# Altium footprint library PART.PcbLib: 407 footprints (part 1 of 26)
Each footprint in its own frame and in the unit in brackets; x right, y up, seen from the top. Pads: shape width x height; smd on the part's side, far side on the other; paste and mask are expansions set on the pad; w line width, h text height; cw(c..) or ccw(c..) is an arc to the next point about the centre after c.
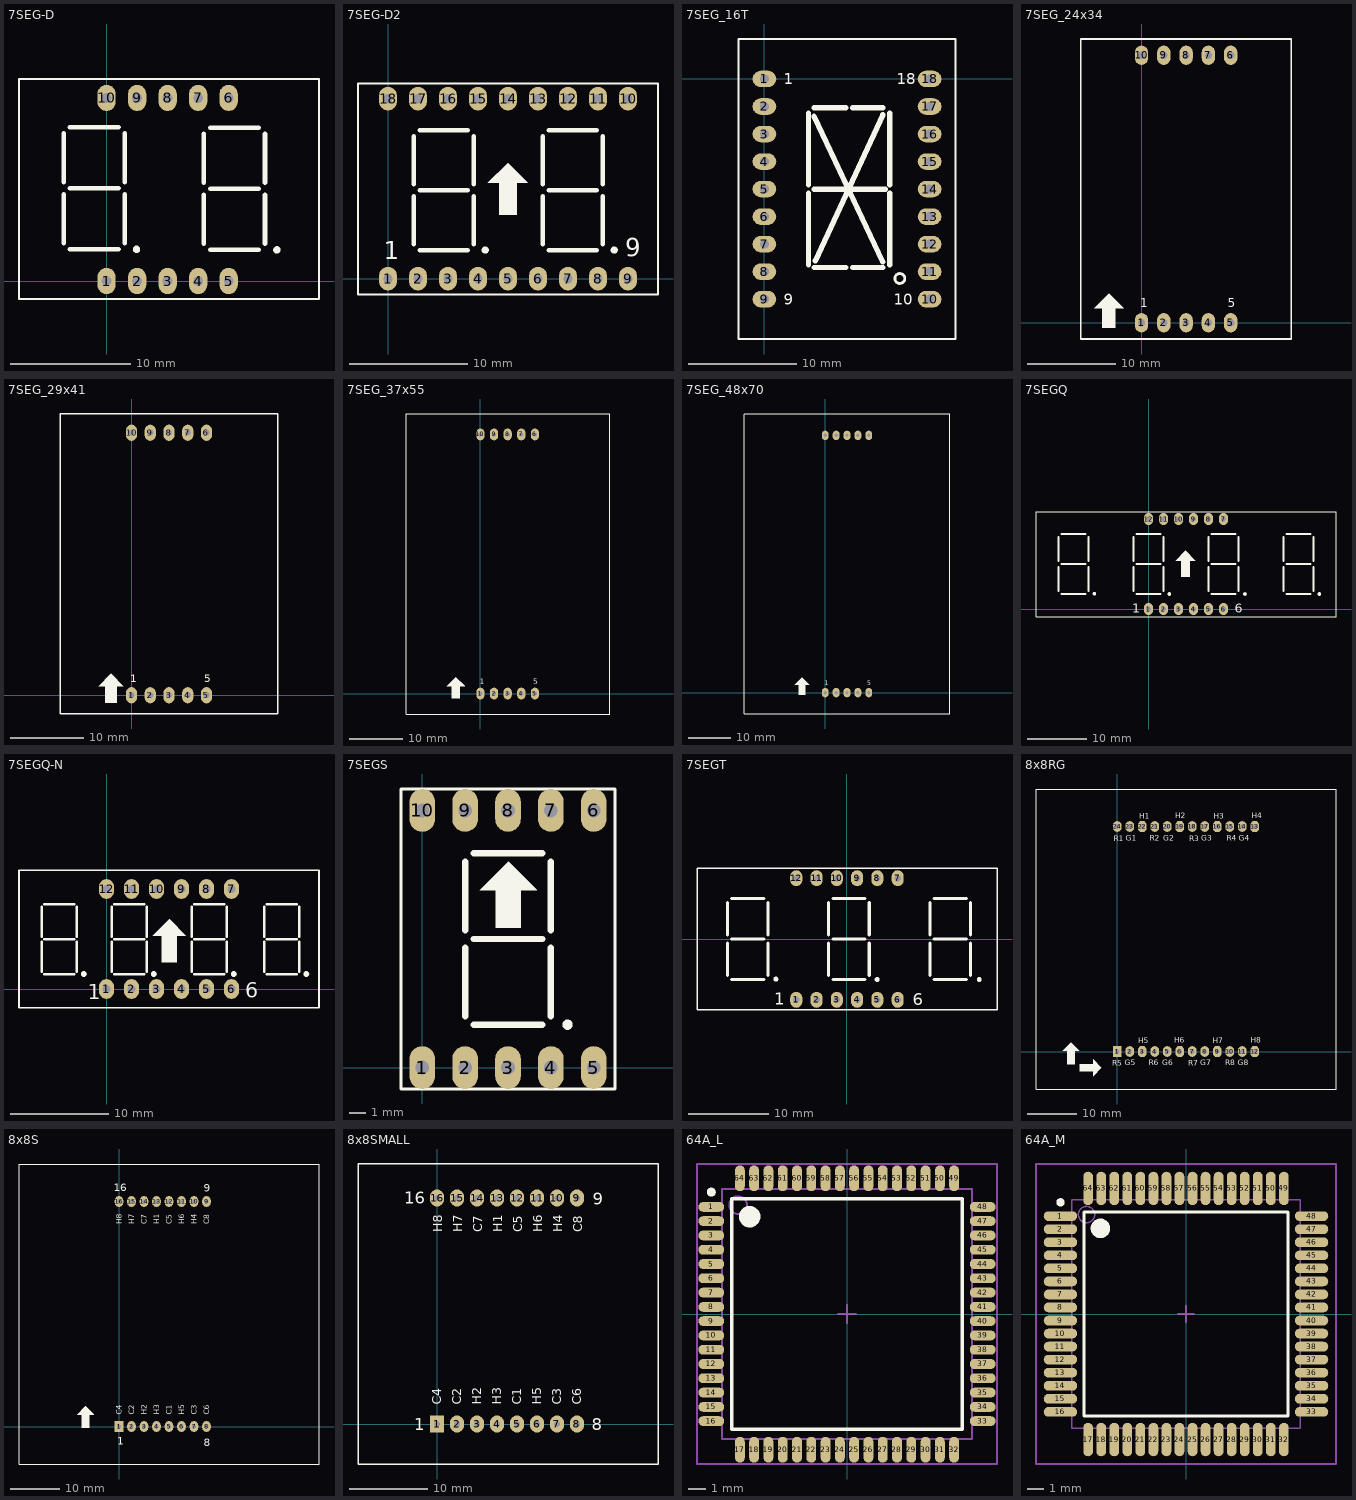
[diagram p0: the footprints below, top view; thin cyan lines are the x and y axes]

## 7SEG-D [mil] "DIP 10 Leads; Body 25 x 19 mm; Pitch 0.5 mm"
height 300
pads (10):
  oval 60x86 hole 32: 1(0,0) 2(100,0) 3(200,0) 4(300,0) 5(400,0) 6(400,600) 7(300,600) 8(200,600) 9(100,600) 10(0,600)
Top Overlay:
  circle w12: c558,102 r6
  circle w12: c98,104 r6
  lines w7: -287,-59 696,-59 696,662 -287,662 -287,-59
  lines w15: -141,124 -141,284 ; -141,124 -141,284 ; -141,124 -141,284 ; -141,124 -141,284 ; -141,124 -141,284 ; -141,124 -141,284 ; -141,124 -141,284 ; -141,124 -141,284 ; -141,324 -141,484 ; -141,324 -141,484 ; -141,324 -141,484 ; -141,324 -141,484 ; -141,324 -141,484 ; -141,324 -141,484 ; -141,324 -141,484 ; -141,324 -141,484 ; -121,104 39,104 ; -121,104 39,104 ; -121,104 39,104 ; -121,104 39,104 ; -121,304 39,304 ; -121,304 39,304 ; -121,304 39,304 ; -121,304 39,304 ; -121,304 39,304 ; -121,304 39,304 ; -121,304 39,304 ; -121,304 39,304 ; -121,504 39,504 ; -121,504 39,504 ; -121,504 39,504 ; -121,504 39,504 ; 59,124 59,284 ; 59,124 59,284 ; 59,124 59,284 ; 59,124 59,284 ; 59,124 59,284 ; 59,124 59,284 ; 59,124 59,284 ; 59,124 59,284 ; 59,324 59,484 ; 59,324 59,484 ; 59,324 59,484 ; 59,324 59,484 ; 59,324 59,484 ; 59,324 59,484 ; 59,324 59,484 ; 59,324 59,484 ; 319,122 319,282 ; 319,122 319,282 ; 319,122 319,282 ; 319,122 319,282 ; 319,122 319,282 ; 319,122 319,282 ; 319,122 319,282 ; 319,122 319,282 ; 319,322 319,482 ; 319,322 319,482 ; 319,322 319,482 ; 319,322 319,482 ; 319,322 319,482 ; 319,322 319,482 ; 319,322 319,482 ; 319,322 319,482 ; 339,102 499,102 ; 339,102 499,102 ; 339,102 499,102 ; 339,102 499,102 ; 339,302 499,302 ; 339,302 499,302 ; 339,302 499,302 ; 339,302 499,302 ; 339,302 499,302 ; 339,302 499,302 ; 339,302 499,302 ; 339,302 499,302 ; 339,502 499,502 ; 339,502 499,502 ; 339,502 499,502 ; 339,502 499,502 ; 519,122 519,282 ; 519,122 519,282 ; 519,122 519,282 ; 519,122 519,282 ; 519,122 519,282 ; 519,122 519,282 ; 519,122 519,282 ; 519,122 519,282 ; 519,322 519,482 ; 519,322 519,482 ; 519,322 519,482 ; 519,322 519,482 ; 519,322 519,482 ; 519,322 519,482 ; 519,322 519,482 ; 519,322 519,482

## 7SEG-D2 [mm] "DIP 18Leads; Body 24 x 15 mm; Pitch 0.5 mm"
height 7.62
pads (18):
  oval 1.524x2 hole 0.8 paste+0: 1(0,0) 2(2.54,0) 3(5.08,0) 5(10.16,0) 6(12.7,0) 7(15.24,0) 8(17.78,0) 9(20.32,0) 10(20.32,15.24) 11(17.78,15.24) 12(15.24,15.24) 13(12.7,15.24) 14(10.16,15.24) 15(7.62,15.24) 16(5.08,15.24) 17(2.54,15.24) 18(0,15.24)
  oval 1.524x2 hole 0.8: 4(7.62,0)
Top Overlay:
  circle w0.305: c8.23,2.413 r0.152
  circle w0.305: c19.152,2.413 r0.152
  region: 8.458,8.103 10.135,9.779 10.185,9.779 11.836,8.128 11.836,8.103 10.897,8.103 10.897,5.41 9.398,5.41 9.398,8.103
  lines w0.178: -2.54,-1.333 -2.54,16.51 ; -2.54,-1.333 -2.54,16.51 ; -2.54,-1.333 -2.54,16.51 ; -2.54,-1.333 -2.54,16.51 ; -2.54,16.51 22.86,16.51 ; -2.54,16.51 22.86,16.51 ; -2.54,16.51 22.86,16.51 ; -2.54,16.51 22.86,16.51 ; 22.86,-1.333 22.86,16.51 ; 22.86,-1.333 22.86,16.51 ; 22.86,-1.333 -2.54,-1.321 22.86,-1.333 ; 22.86,-1.333 22.86,16.51 ; 22.86,-1.333 22.86,16.51
  lines w0.381: 2.159,2.921 2.159,6.985 ; 2.159,2.921 2.159,6.985 ; 2.159,2.921 2.159,6.985 ; 2.159,2.921 2.159,6.985 ; 2.159,2.921 2.159,6.985 ; 2.159,2.921 2.159,6.985 ; 2.159,2.921 2.159,6.985 ; 2.159,2.921 2.159,6.985 ; 2.159,8.001 2.159,12.065 ; 2.159,8.001 2.159,12.065 ; 2.159,8.001 2.159,12.065 ; 2.159,8.001 2.159,12.065 ; 2.159,8.001 2.159,12.065 ; 2.159,8.001 2.159,12.065 ; 2.159,8.001 2.159,12.065 ; 2.159,8.001 2.159,12.065 ; 2.667,2.413 6.731,2.413 ; 2.667,2.413 6.731,2.413 ; 2.667,2.413 6.731,2.413 ; 2.667,2.413 6.731,2.413 ; 2.667,7.493 6.731,7.493 ; 2.667,7.493 6.731,7.493 ; 2.667,7.493 6.731,7.493 ; 2.667,7.493 6.731,7.493 ; 2.667,7.493 6.731,7.493 ; 2.667,7.493 6.731,7.493 ; 2.667,7.493 6.731,7.493 ; 2.667,7.493 6.731,7.493 ; 2.667,12.573 6.731,12.573 ; 2.667,12.573 6.731,12.573 ; 2.667,12.573 6.731,12.573 ; 2.667,12.573 6.731,12.573 ; 7.239,2.921 7.239,6.985 ; 7.239,2.921 7.239,6.985 ; 7.239,2.921 7.239,6.985 ; 7.239,2.921 7.239,6.985 ; 7.239,2.921 7.239,6.985 ; 7.239,2.921 7.239,6.985 ; 7.239,2.921 7.239,6.985 ; 7.239,2.921 7.239,6.985 ; 7.239,8.001 7.239,12.065 ; 7.239,8.001 7.239,12.065 ; 7.239,8.001 7.239,12.065 ; 7.239,8.001 7.239,12.065 ; 7.239,8.001 7.239,12.065 ; 7.239,8.001 7.239,12.065 ; 7.239,8.001 7.239,12.065 ; 7.239,8.001 7.239,12.065 ; 13.081,2.921 13.081,6.985 ; 13.081,2.921 13.081,6.985 ; 13.081,2.921 13.081,6.985 ; 13.081,2.921 13.081,6.985 ; 13.081,2.921 13.081,6.985 ; 13.081,2.921 13.081,6.985 ; 13.081,2.921 13.081,6.985 ; 13.081,2.921 13.081,6.985 ; 13.081,8.001 13.081,12.065 ; 13.081,8.001 13.081,12.065 ; 13.081,8.001 13.081,12.065 ; 13.081,8.001 13.081,12.065 ; 13.081,8.001 13.081,12.065 ; 13.081,8.001 13.081,12.065 ; 13.081,8.001 13.081,12.065 ; 13.081,8.001 13.081,12.065 ; 13.589,2.413 17.653,2.413 ; 13.589,2.413 17.653,2.413 ; 13.589,2.413 17.653,2.413 ; 13.589,2.413 17.653,2.413 ; 13.589,7.493 17.653,7.493 ; 13.589,7.493 17.653,7.493 ; 13.589,7.493 17.653,7.493 ; 13.589,7.493 17.653,7.493 ; 13.589,7.493 17.653,7.493 ; 13.589,7.493 17.653,7.493 ; 13.589,7.493 17.653,7.493 ; 13.589,7.493 17.653,7.493 ; 13.589,12.573 17.653,12.573 ; 13.589,12.573 17.653,12.573 ; 13.589,12.573 17.653,12.573 ; 13.589,12.573 17.653,12.573 ; 18.161,2.921 18.161,6.985 ; 18.161,2.921 18.161,6.985 ; 18.161,2.921 18.161,6.985 ; 18.161,2.921 18.161,6.985 ; 18.161,2.921 18.161,6.985 ; 18.161,2.921 18.161,6.985 ; 18.161,2.921 18.161,6.985 ; 18.161,2.921 18.161,6.985 ; 18.161,8.001 18.161,12.065 ; 18.161,8.001 18.161,12.065 ; 18.161,8.001 18.161,12.065 ; 18.161,8.001 18.161,12.065 ; 18.161,8.001 18.161,12.065 ; 18.161,8.001 18.161,12.065 ; 18.161,8.001 18.161,12.065 ; 18.161,8.001 18.161,12.065
  text "9" at 20.066,1.905 h1.52
  text "1" at -0.356,1.651 h1.52

## 7SEG_16T [mil] "DIP 10 Leads; Body 24 x 34 mm; Pitch 0.5 mm"
height 300
pads (18):
  oval 86x60 hole 32: 1(0,0) 2(0,-100) 3(0,-200) 4(0,-300) 5(0,-400) 6(0,-500) 7(0,-600) 8(0,-700) 9(0,-800) 10(600,-800) 11(600,-700) 12(600,-600) 13(600,-500) 14(600,-400) 15(600,-300) 16(600,-200) 17(600,-100) 18(600,0)
Top Overlay:
  circle w10: c491.97,-725 r18.03
  lines w7: -93.7,-944.88 693.7,-944.88 693.7,145.28 -93.7,145.28 -93.7,-940.55
  lines w19.68: 160,-675 160,-415 ; 160,-385 160,-125 ; 180,-685 295,-685 ; 180,-400 440,-400 ; 180,-135 430,-665 ; 180,-105 295,-105 ; 185,-660 430,-130 ; 320,-685 430,-685 ; 320,-105 430,-105 ; 455,-675 455,-415 ; 455,-385 455,-125
  text "18" at 480,-20 h40
  text "10" at 470,-820 h40
  text "1" at 70,-20 h40
  text "9" at 70,-820 h40

## 7SEG_24x34 [mil] "DIP 10 Leads; Body 24 x 34 mm; Pitch 0.5 mm"
height 300
pads (10):
  oval 60x86 hole 32: 1(0,0) 2(100,0) 3(200,0) 4(300,0) 5(400,0) 6(400,1200) 7(300,1200) 8(200,1200) 9(100,1200) 10(0,1200)
Top Overlay:
  region: -213,65 -147,131 -145,131 -80,66 -80,65 -117,65 -117,-23 -176,-23 -176,65
  lines w7: -273,-73 -273,1273 672,1273 672,-73 -273,-73
  text "5" at 386.67,69 h40
  text "1" at -6.66,69 h40

## 7SEG_29x41 [mil] "DIP 10 Leads; Body 29 x 41 mm; Pitch 0.5 mm"
height 300
pads (10):
  oval 60x86 hole 32: 1(0,0) 2(100,0) 3(200,0) 4(300,0) 5(400,0) 6(400,1400) 7(300,1400) 8(200,1400) 9(100,1400) 10(0,1400)
Top Overlay:
  region: -176,48 -110,114 -108,114 -43,49 -43,48 -80,48 -80,-40 -139,-40 -139,48
  lines w7: -380,-100 -380,1500 780,1500 780,-100 -380,-100
  text "1" at -5.66,69 h40
  text "5" at 387.67,69 h40

## 7SEG_37x55 [mil] "DIP 10 Leads; Body 29 x 41 mm; Pitch 0.5 mm"
height 300
pads (10):
  oval 60x86 hole 32: 1(0,0) 2(100,0) 3(200,0) 4(300,0) 5(400,0) 6(400,1900) 7(300,1900) 8(200,1900) 9(100,1900) 10(0,1900)
Top Overlay:
  region: -248,55 -182,121 -180,121 -115,56 -115,55 -152,55 -152,-33 -211,-33 -211,55
  lines w7: -545,-150 -545,2050 950,2050 950,-150 -545,-150
  text "1" at -5.66,67 h40
  text "5" at 387.67,67 h40

## 7SEG_48x70 [mm] "DIP 10 Leads; Body 47,76 x 70mm; Pitch 0.5 mm"
height 7.62
pads (10):
  oval 1.6x2.2 hole 0.813: 1(0,0) 2(2.54,0) 3(5.08,0) 4(7.62,0) 5(10.16,0) 6(10.16,60) 7(7.62,60) 8(5.08,60) 9(2.54,60) 10(0,60)
Top Overlay:
  region: -7.112,1.778 -5.436,3.454 -5.385,3.454 -3.734,1.803 -3.734,1.778 -4.674,1.778 -4.674,-0.457 -6.172,-0.457 -6.172,1.778
  lines w0.178: -18.92,65 29.08,65 ; -18.92,-5 29.08,-5 -18.92,-5
  lines w0.203: -18.923,-4.928 -18.923,64.999 ; 29.058,-4.928 29.058,64.999
  text "5" at 9.847,1.702 h1.02
  text "1" at -0.144,1.702 h1.02

## 7SEGQ [mm] "DIP 12 Leads; Body 48 x 20 mm; Pitch 0.5 mm"
height 7.62
pads (12):
  oval 1.524x2 hole 0.8: 1(0,0) 2(2.54,0) 3(5.08,0) 4(7.62,0) 5(10.16,0) 6(12.7,0) 7(12.7,15.24) 8(10.16,15.24) 9(7.62,15.24) 10(5.08,15.24) 11(2.54,15.24) 12(0,15.24)
Top Overlay:
  drawing of 155 lines, arcs and shapes, not listed
  text "6" at 14.605,-0.66 h1.52
  text "1" at -2.743,-0.61 h1.52

## 7SEGQ-N [mm] "DIP 12 Leads; Body 32x 15 mm; Pitch 0.5 mm"
height 7.62
pads (12):
  oval 1.524x2 hole 0.8: 1(0,0) 2(2.54,0) 3(5.08,0) 4(7.62,0) 5(10.16,0) 6(12.7,0) 7(12.7,10.16) 8(10.16,10.16) 9(7.62,10.16) 10(5.08,10.16) 11(2.54,10.16) 12(0,10.16)
Top Overlay:
  circle w0.305: c12.929,1.524 r0.152
  circle w0.305: c20.295,1.524 r0.152
  circle w0.305: c-2.311,1.524 r0.152
  circle w0.305: c4.801,1.524 r0.152
  region: 4.674,5.41 6.35,7.087 6.401,7.087 8.052,5.436 8.052,5.41 7.112,5.41 7.112,2.718 5.613,2.718 5.613,5.41
  lines w0.178: -8.89,-1.905 -8.89,12.065 21.59,12.065 21.59,-1.905 -8.89,-1.905
  lines w0.254: -6.604,1.778 -6.604,4.826 ; -6.604,5.334 -6.604,8.382 ; -6.35,1.524 -3.302,1.524 ; -6.35,8.636 -3.302,8.636 ; -3.048,1.778 -3.048,4.826 ; -3.048,5.334 -3.048,8.382 ; 0.508,1.778 0.508,4.826 ; 0.508,5.334 0.508,8.382 ; 0.762,1.524 3.81,1.524 ; 0.762,8.636 3.81,8.636 ; 4.064,1.778 4.064,4.826 ; 4.064,5.334 4.064,8.382 ; 8.636,1.778 8.636,4.826 ; 8.636,5.334 8.636,8.382 ; 8.89,1.524 11.938,1.524 ; 8.89,8.636 11.938,8.636 ; 12.192,1.778 12.192,4.826 ; 12.192,5.334 12.192,8.382 ; 16.002,1.778 16.002,4.826 ; 16.002,5.334 16.002,8.382 ; 16.256,1.524 19.304,1.524 ; 16.256,8.636 19.304,8.636 ; 19.558,1.778 19.558,4.826 ; 19.558,5.334 19.558,8.382 ; -6.35,5.08 -3.302,5.08 -6.35,5.08 ; 0.762,5.08 3.81,5.08 0.762,5.08 ; 8.89,5.08 11.938,5.08 8.89,5.08 ; 16.256,5.08 19.304,5.08 16.256,5.08
  text "1" at -1.905,-1.016 h1.52
  text "6" at 14.097,-0.889 h1.52

## 7SEGS [mil] "DIP 10 Leads; Body 12 x 15 mm; Pitch 0.5 mm"
height 300
pads (10):
  oval 60x100 hole 32: 1(0,0) 2(100,0) 3(200,0) 4(300,0) 5(400,0) 6(400,600) 7(300,600) 8(200,600) 9(100,600) 10(0,600)
Top Overlay:
  circle w12: c339,100 r6
  region: 134,414 200,480 202,480 267,415 267,414 230,414 230,326 171,326 171,414
  lines w7: -50,-50 -50,650 450,650 450,-50 -50,-50
  lines w15: 100,120 100,280 ; 100,120 100,280 ; 100,120 100,280 ; 100,120 100,280 ; 100,120 100,280 ; 100,120 100,280 ; 100,120 100,280 ; 100,120 100,280 ; 100,320 100,480 ; 100,320 100,480 ; 100,320 100,480 ; 100,320 100,480 ; 100,320 100,480 ; 100,320 100,480 ; 100,320 100,480 ; 100,320 100,480 ; 120,100 280,100 ; 120,100 280,100 ; 120,100 280,100 ; 120,100 280,100 ; 120,300 280,300 ; 120,300 280,300 ; 120,300 280,300 ; 120,300 280,300 ; 120,300 280,300 ; 120,300 280,300 ; 120,300 280,300 ; 120,300 280,300 ; 120,500 280,500 ; 120,500 280,500 ; 120,500 280,500 ; 120,500 280,500 ; 300,120 300,280 ; 300,120 300,280 ; 300,120 300,280 ; 300,120 300,280 ; 300,120 300,280 ; 300,120 300,280 ; 300,120 300,280 ; 300,120 300,280 ; 300,320 300,480 ; 300,320 300,480 ; 300,320 300,480 ; 300,320 300,480 ; 300,320 300,480 ; 300,320 300,480 ; 300,320 300,480 ; 300,320 300,480
3D body: height 316.25, standoff -156.19, extent -50,-75 450,675

## 7SEGT [mm] "DIP 12 Leads; Body 48 x 20 mm; Pitch 0.5 mm"
height 7.62
pads (12):
  oval 1.524x2 hole 0.8: 1(-6.35,-7.62) 2(-3.81,-7.62) 3(-1.27,-7.62) 4(1.27,-7.62) 5(3.81,-7.62) 6(6.35,-7.62) 7(6.35,7.62) 8(3.81,7.62) 9(1.27,7.62) 10(-1.27,7.62) 11(-3.81,7.62) 12(-6.35,7.62)
Top Overlay:
  circle w0.305: c-8.915,-5.029 r0.152
  circle w0.305: c3.785,-5.08 r0.152
  circle w0.305: c16.586,-5.08 r0.152
  lines w0.178: -18.796,-8.89 18.804,-8.89 18.804,8.89 -18.796,8.89 -18.796,-8.89
  lines w0.381: -14.986,-4.572 -14.986,-0.508 ; -14.986,-4.572 -14.986,-0.508 ; -14.986,-4.572 -14.986,-0.508 ; -14.986,-4.572 -14.986,-0.508 ; -14.986,0.508 -14.986,4.572 ; -14.986,0.508 -14.986,4.572 ; -14.986,0.508 -14.986,4.572 ; -14.986,0.508 -14.986,4.572 ; -14.478,0 -10.414,0 ; -14.478,0 -10.414,0 ; -14.478,0 -10.414,0 ; -14.478,0 -10.414,0 ; -9.906,-4.572 -9.906,-0.508 ; -9.906,-4.572 -9.906,-0.508 ; -9.906,-4.572 -9.906,-0.508 ; -9.906,-4.572 -9.906,-0.508 ; -9.906,0.508 -9.906,4.572 ; -9.906,0.508 -9.906,4.572 ; -9.906,0.508 -9.906,4.572 ; -9.906,0.508 -9.906,4.572 ; -2.286,-4.572 -2.286,-0.508 ; -2.286,-4.572 -2.286,-0.508 ; -2.286,-4.572 -2.286,-0.508 ; -2.286,-4.572 -2.286,-0.508 ; -2.286,0.508 -2.286,4.572 ; -2.286,0.508 -2.286,4.572 ; -2.286,0.508 -2.286,4.572 ; -2.286,0.508 -2.286,4.572 ; -1.778,0 2.286,0 ; -1.778,0 2.286,0 ; -1.778,0 2.286,0 ; -1.778,0 2.286,0 ; 2.794,-4.572 2.794,-0.508 ; 2.794,-4.572 2.794,-0.508 ; 2.794,-4.572 2.794,-0.508 ; 2.794,-4.572 2.794,-0.508 ; 2.794,0.508 2.794,4.572 ; 2.794,0.508 2.794,4.572 ; 2.794,0.508 2.794,4.572 ; 2.794,0.508 2.794,4.572 ; 10.414,-4.572 10.414,-0.508 ; 10.414,-4.572 10.414,-0.508 ; 10.414,-4.572 10.414,-0.508 ; 10.414,-4.572 10.414,-0.508 ; 10.414,-4.572 10.414,-0.508 ; 10.414,-4.572 10.414,-0.508 ; 10.414,-4.572 10.414,-0.508 ; 10.414,-4.572 10.414,-0.508 ; 10.414,0.508 10.414,4.572 ; 10.414,0.508 10.414,4.572 ; 10.414,0.508 10.414,4.572 ; 10.414,0.508 10.414,4.572 ; 10.414,0.508 10.414,4.572 ; 10.414,0.508 10.414,4.572 ; 10.414,0.508 10.414,4.572 ; 10.414,0.508 10.414,4.572 ; 10.922,-5.08 14.986,-5.08 ; 10.922,-5.08 14.986,-5.08 ; 10.922,-5.08 14.986,-5.08 ; 10.922,-5.08 14.986,-5.08 ; 10.922,0 14.986,0 ; 10.922,0 14.986,0 ; 10.922,0 14.986,0 ; 10.922,0 14.986,0 ; 10.922,0 14.986,0 ; 10.922,0 14.986,0 ; 10.922,0 14.986,0 ; 10.922,0 14.986,0 ; 10.922,5.08 14.986,5.08 ; 10.922,5.08 14.986,5.08 ; 10.922,5.08 14.986,5.08 ; 10.922,5.08 14.986,5.08 ; 15.494,-4.572 15.494,-0.508 ; 15.494,-4.572 15.494,-0.508 ; 15.494,-4.572 15.494,-0.508 ; 15.494,-4.572 15.494,-0.508 ; 15.494,-4.572 15.494,-0.508 ; 15.494,-4.572 15.494,-0.508 ; 15.494,-4.572 15.494,-0.508 ; 15.494,-4.572 15.494,-0.508 ; 15.494,0.508 15.494,4.572 ; 15.494,0.508 15.494,4.572 ; 15.494,0.508 15.494,4.572 ; 15.494,0.508 15.494,4.572 ; 15.494,0.508 15.494,4.572 ; 15.494,0.508 15.494,4.572 ; 15.494,0.508 15.494,4.572 ; 15.494,0.508 15.494,4.572 ; -14.478,-5.08 -10.414,-5.08 -14.478,-5.08 ; -14.478,5.08 -10.414,5.08 -14.478,5.08 ; -1.778,-5.08 2.286,-5.08 -1.778,-5.08 ; -1.778,5.08 2.286,5.08 -1.778,5.08
  text "1" at -9.093,-8.23 h1.52
  text "6" at 8.255,-8.28 h1.52

## 8x8RG [mil] "Matran 8x8 2mau,Body 60 X 60mm"
height 300
pads (24):
  rect 70x85 hole 37.4: 1(0,0)
  oval 70x85 hole 37.4: 2(100,0) 4(300,0) 5(400,0) 7(600,0) 8(700,0) 10(900,0) 11(1000,0) 14(1000,1800) 15(900,1800) 17(700,1800) 18(600,1800) 20(400,1800) 21(300,1800) 23(100,1800) 24(0,1800)
  oct 70x85 hole 37.4: 3(200,0) 6(500,0) 9(800,0) 12(1100,0) 13(1100,1800) 16(800,1800) 19(500,1800) 22(200,1800)
Top Overlay:
  region: -437,5 -371,71 -369,71 -304,6 -304,5 -341,5 -341,-101 -400,-101 -400,5
  region: -193,-63 -127,-129 -127,-131 -192,-196 -193,-196 -193,-159 -299,-159 -299,-100 -193,-100
  lines w7: -650,-300 1750,-300 ; -650,-300 -650,2100 ; -650,-300 -650,2100 ; -650,2100 1750,2100 ; 1750,-300 1750,2100 ; 1750,-300 1750,2100
  text "R8" at 863,-111 h45
  text "G8" at 962,-110 h45
  text "H8" at 1068,69 h45
  text "R7" at 568,-112 h45
  text "G7" at 664,-111 h45
  text "H7" at 765,68 h45
  text "R6" at 250,-111 h45
  text "G6" at 358,-111 h45
  text "H6" at 456,69 h45
  text "H5" at 166,68 h45
  text "G5" at 60,-111 h45
  text "R5" at -40,-112 h45
  text "R1" at -28,1684 h45
  text "G1" at 68,1685 h45
  text "H1" at 174,1864 h45
  text "H2" at 464,1865 h45
  text "G2" at 366,1685 h45
  text "R2" at 258,1685 h45
  text "H3" at 773,1864 h45
  text "G3" at 672,1685 h45
  text "R3" at 576,1684 h45
  text "H4" at 1076,1865 h45
  text "G4" at 970,1686 h45
  text "R4" at 874,1685 h45
Bottom Overlay:
  text "R8" at 932,-111 h45
  text "G8" at 1031,-110 h45
  text "H8" at 1137,69 h45
  text "R7" at 637,-112 h45
  text "G7" at 733,-111 h45
  text "H7" at 834,68 h45
  text "R6" at 319,-111 h45
  text "G6" at 427,-111 h45
  text "H6" at 525,69 h45
  text "H5" at 235,68 h45
  text "G5" at 129,-111 h45
  text "R5" at 29,-112 h45
  text "R1" at 41,1684 h45
  text "G1" at 137,1685 h45
  text "H1" at 243,1864 h45
  text "H2" at 533,1865 h45
  text "G2" at 435,1685 h45
  text "R2" at 327,1685 h45
  text "H3" at 842,1864 h45
  text "G3" at 741,1685 h45
  text "R3" at 645,1684 h45
  text "H4" at 1145,1865 h45
  text "G4" at 1039,1686 h45
  text "R4" at 943,1685 h45

## 8x8S [mil] "Matran 8x8, Body 60 X 60mm"
height 300
pads (16):
  rect 70x85 hole 31: 1(0,0)
  oval 70x85 hole 31: 2(100,0) 3(200,0) 4(300,0) 5(400,0) 6(500,0) 7(600,0) 8(700,0) 9(700,1800) 10(600,1800) 11(500,1800) 12(400,1800) 13(300,1800) 14(200,1800) 15(100,1800) 16(0,1800)
Top Overlay:
  region: -336,96 -270,162 -268,162 -203,97 -203,96 -240,96 -240,-10 -299,-10 -299,96
  lines w7: -800,-300 -800,2100 ; -800,-300 -800,2100 ; -800,-300 1600,-300 ; -800,-300 1600,-300 ; -800,2100 1600,2100 ; -800,2100 1600,2100 ; 1600,-300 1600,2100 ; 1600,-300 1600,2100
  text "H1" at 322.49,1620 h45
  text "H2" at 222.49,96 h45
  text "H3" at 322.49,96 h45
  text "H4" at 622.49,1620 h45
  text "16" at -42,1881 h60
  text "9" at 679,1880 h60
  text "8" at 678,-156 h60
  text "1" at -15,-144 h60
  text "C4" at 22.49,96 h45
  text "C3" at 622.49,96 h45
  text "C2" at 122.49,96 h45
  text "C1" at 422.49,96 h45
  text "C5" at 422.49,1620 h45
  text "H5" at 522.49,96 h45
  text "H6" at 522.49,1620 h45
  text "C6" at 722.49,96 h45
  text "H7" at 122.49,1620 h45
  text "C7" at 222.49,1620 h45
  text "H8" at 22.49,1620 h45
  text "C8" at 722.49,1620 h45

## 8x8SMALL [mil] "M15088, Matrix 8x8 - Body 38 X 38mm"
height 314.96
pads (16):
  rect 70x85 hole 31: 1(0,0)
  oval 70x85 hole 31: 2(100,0) 3(200,0) 4(300,0) 5(400,0) 6(500,0) 7(600,0) 8(700,0) 9(700,1129.92) 10(600,1129.92) 11(500,1129.92) 12(400,1129.92) 13(300,1129.92) 14(200,1129.92) 15(100,1129.92) 16(0,1129.92)
Top Overlay:
  lines w7: -395,-200 1105,-200 1105,1300 -395,1300 -395,-200
  text "C8" at 727.49,960 h45
  text "H8" at 27.49,960 h45
  text "C7" at 227.49,960 h45
  text "H7" at 127.49,960 h45
  text "C6" at 722.49,96 h45
  text "H6" at 527.49,960 h45
  text "H5" at 522.49,96 h45
  text "C5" at 427.49,960 h45
  text "C1" at 422.49,96 h45
  text "C2" at 122.49,96 h45
  text "C3" at 622.49,96 h45
  text "C4" at 22.49,96 h45
  text "1" at -115,-30 h60
  text "8" at 775,-30 h60
  text "9" at 780,1095 h60
  text "16" at -165,1100 h60
  text "H4" at 627.49,960 h45
  text "H3" at 322.49,96 h45
  text "H2" at 222.49,96 h45
  text "H1" at 327.49,960 h45

## 64A_L [mm] "Thin QFP, 64-Leads, Body 14x14mm, Pitch 0.8mm, IPC High Density"
height 1.2
pads (64):
  oval 1.45x0.55 smd: 1(-7.6,6) 2(-7.6,5.2) 3(-7.6,4.4) 4(-7.6,3.6) 5(-7.6,2.8) 6(-7.6,2) 7(-7.6,1.2) 8(-7.6,0.4) 9(-7.6,-0.4) 10(-7.6,-1.2) 11(-7.6,-2) 12(-7.6,-2.8) 13(-7.6,-3.6) 14(-7.6,-4.4) 15(-7.6,-5.2) 16(-7.6,-6) 33(7.6,-6) 34(7.6,-5.2) 35(7.6,-4.4) 36(7.6,-3.6) 37(7.6,-2.8) 38(7.6,-2) 39(7.6,-1.2) 40(7.6,-0.4) 41(7.6,0.4) 42(7.6,1.2) 43(7.6,2) 44(7.6,2.8) 45(7.6,3.6) 46(7.6,4.4) 47(7.6,5.2) 48(7.6,6)
  oval 0.55x1.45 smd: 17(-6,-7.6) 18(-5.2,-7.6) 19(-4.4,-7.6) 20(-3.6,-7.6) 21(-2.8,-7.6) 22(-2,-7.6) 23(-1.2,-7.6) 24(-0.4,-7.6) 25(0.4,-7.6) 26(1.2,-7.6) 27(2,-7.6) 28(2.8,-7.6) 29(3.6,-7.6) 30(4.4,-7.6) 31(5.2,-7.6) 32(6,-7.6) 49(6,7.6) 50(5.2,7.6) 51(4.4,7.6) 52(3.6,7.6) 53(2.8,7.6) 54(2,7.6) 55(1.2,7.6) 56(0.4,7.6) 57(-0.4,7.6) 58(-1.2,7.6) 59(-2,7.6) 60(-2.8,7.6) 61(-3.6,7.6) 62(-4.4,7.6) 63(-5.2,7.6) 64(-6,7.6)
Top Overlay:
  circle w0.25: c-7.6,6.825 r0.125
  circle w0.6: c-5.45,5.45 r0.3
  lines w0.2: -6.45,-6.45 -6.45,6.45 6.45,6.45 6.45,-6.45 -6.45,-6.45
Mechanical 13:
  circle w0.1: c-6.1,6.1 r0.5
  lines w0.1: -7,-7 -7,7 7,7 7,-7 -7,-7
Mechanical 15:
  lines w0.1: -0.5,0 0.5,0 ; 0,-0.5 0,0.5 ; -8.4,-8.4 -8.4,8.4 8.4,8.4 8.4,-8.4 -8.4,-8.4
3D body: height 1.2, standoff 0, extent -7,-7 7,7

## 64A_M [mm] "Thin QFP, 64-Leads, Body 14x14mm, Pitch 0.8mm, IPC Low Density"
height 1.2
pads (64):
  oval 2.05x0.6 smd: 1(-7.7,6) 2(-7.7,5.2) 3(-7.7,4.4) 4(-7.7,3.6) 5(-7.7,2.8) 6(-7.7,2) 7(-7.7,1.2) 8(-7.7,0.4) 9(-7.7,-0.4) 10(-7.7,-1.2) 11(-7.7,-2) 12(-7.7,-2.8) 13(-7.7,-3.6) 14(-7.7,-4.4) 15(-7.7,-5.2) 16(-7.7,-6) 33(7.7,-6) 34(7.7,-5.2) 35(7.7,-4.4) 36(7.7,-3.6) 37(7.7,-2.8) 38(7.7,-2) 39(7.7,-1.2) 40(7.7,-0.4) 41(7.7,0.4) 42(7.7,1.2) 43(7.7,2) 44(7.7,2.8) 45(7.7,3.6) 46(7.7,4.4) 47(7.7,5.2) 48(7.7,6)
  oval 0.6x2.05 smd: 17(-6,-7.7) 18(-5.2,-7.7) 19(-4.4,-7.7) 20(-3.6,-7.7) 21(-2.8,-7.7) 22(-2,-7.7) 23(-1.2,-7.7) 24(-0.4,-7.7) 25(0.4,-7.7) 26(1.2,-7.7) 27(2,-7.7) 28(2.8,-7.7) 29(3.6,-7.7) 30(4.4,-7.7) 31(5.2,-7.7) 32(6,-7.7) 49(6,7.7) 50(5.2,7.7) 51(4.4,7.7) 52(3.6,7.7) 53(2.8,7.7) 54(2,7.7) 55(1.2,7.7) 56(0.4,7.7) 57(-0.4,7.7) 58(-1.2,7.7) 59(-2,7.7) 60(-2.8,7.7) 61(-3.6,7.7) 62(-4.4,7.7) 63(-5.2,7.7) 64(-6,7.7)
Top Overlay:
  circle w0.25: c-7.7,6.85 r0.125
  circle w0.6: c-5.25,5.25 r0.3
  lines w0.2: -6.25,-6.25 -6.25,6.25 6.25,6.25 6.25,-6.25 -6.25,-6.25
Mechanical 13:
  circle w0.1: c-6.1,6.1 r0.5
  lines w0.1: -7,-7 -7,7 7,7 7,-7 -7,-7
Mechanical 15:
  lines w0.1: -0.5,0 0.5,0 ; 0,-0.5 0,0.5 ; -9.2,-9.2 -9.2,9.2 9.2,9.2 9.2,-9.2 -9.2,-9.2
3D body: height 1.2, standoff 0, extent -7,-7 7,7